# Altium footprint library Hydra_Ref_pcb.PcbLib: 353 footprints (part 16 of 23)
Each footprint in its own frame and in the unit in brackets; x right, y up, seen from the top. Pads: shape width x height; smd on the part's side, far side on the other; paste and mask are expansions set on the pad; w line width, h text height; cw(c..) or ccw(c..) is an arc to the next point about the centre after c.
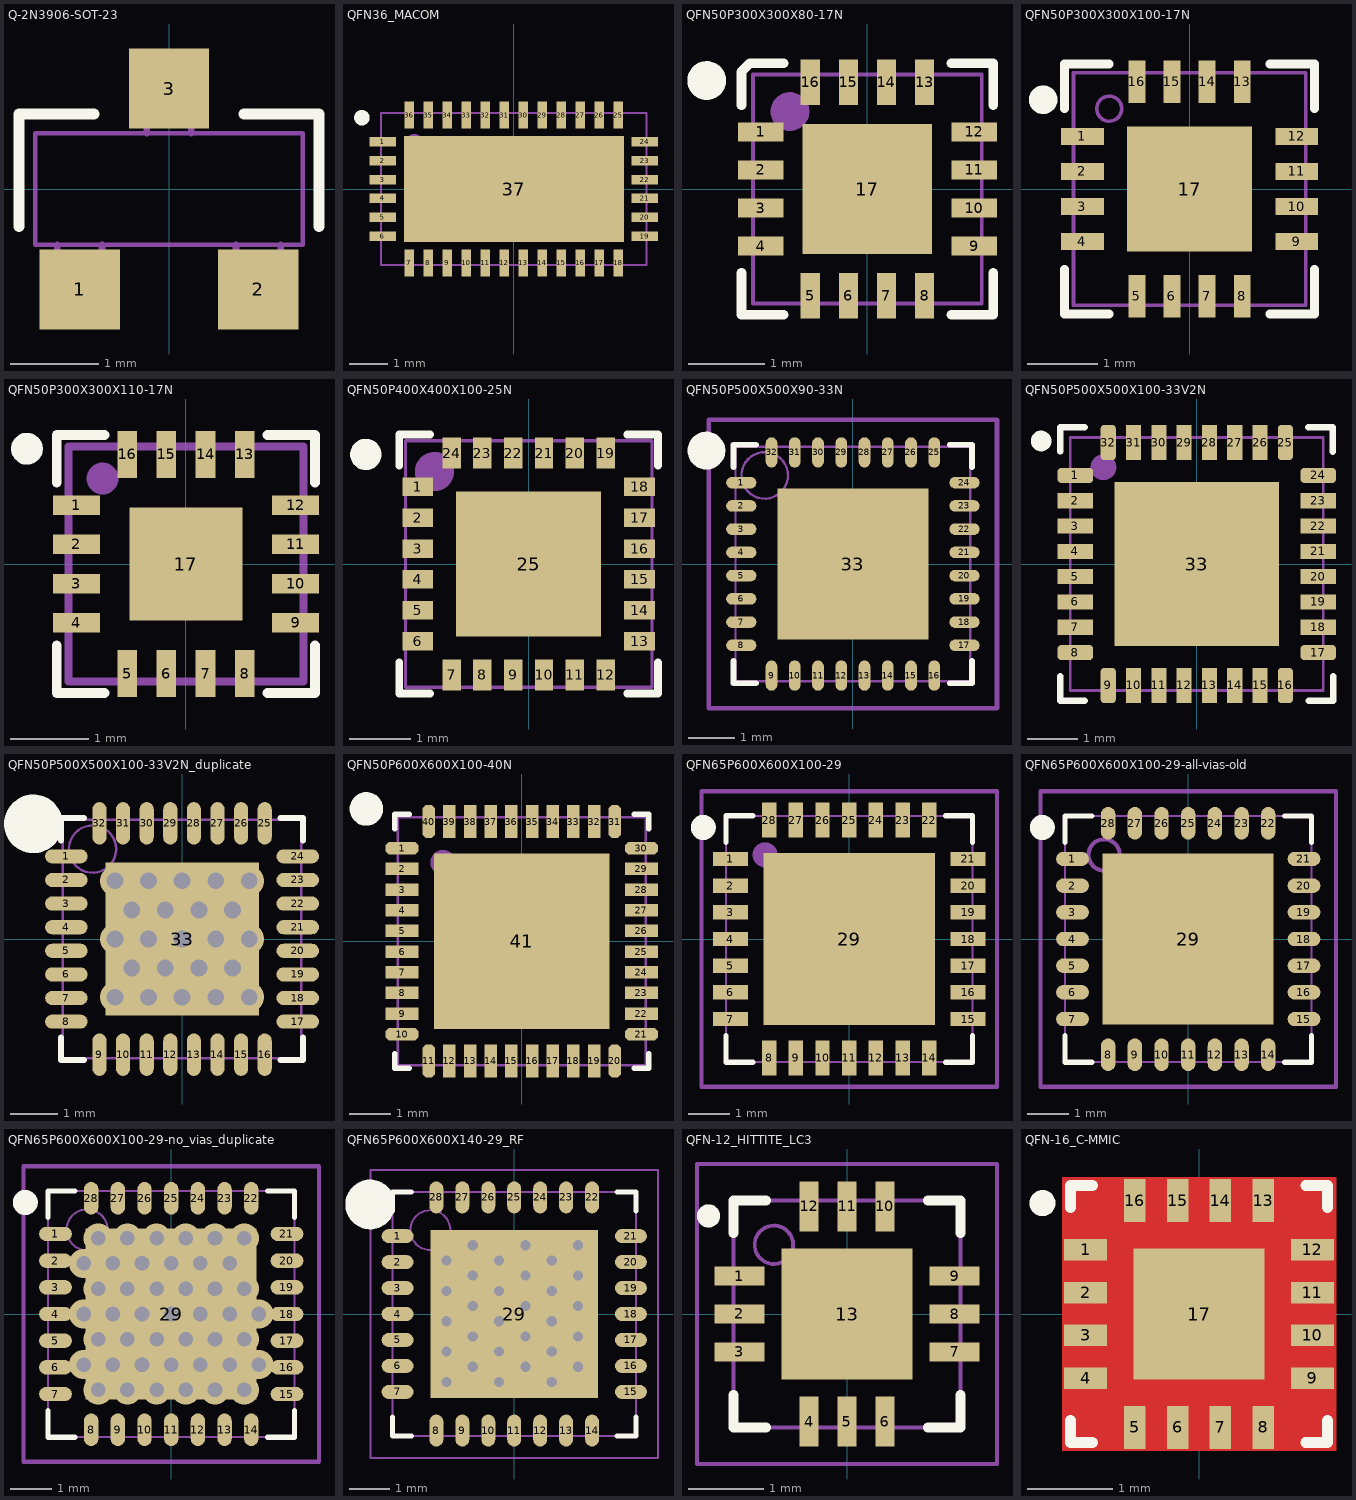
[diagram p15: the footprints below, top view; thin cyan lines are the x and y axes]

## Q-2N3906-SOT-23 [mil] "old part"
pads (3):
  rect 36x36 smd: 1(-40,-45) 2(40,-45) 3(0,45)
Top Overlay:
  lines w5: -67.2,-16.8 -67.2,33.6 -33.6,33.6 ; 33.6,33.6 67.2,33.6 67.2,-16.8
1 Board Outline:
  lines w3: -50,-40 -30,-40 ; -50,-25 -50,-50 -30,-50 -30,-25 ; -10,25 -10,50 10,50 10,25 ; -10,40 10,40 ; 30,-40 50,-40 ; 30,-25 30,-50 50,-50 50,-25
9 Top Assy:
  lines w2: -60,-25 60,-25 60,25 -60,25 -60,-25
  text ".Designator" at -50.4,-16.8 h30

## QFN36_MACOM [mm] "CSP-2, LEAD-FREE 4 X 7 MM, 36-LEAD PQFN"
height 1
pads (37):
  rect 0.7x0.25 smd mask+0.051: 1(-3.45,1.25) 2(-3.45,0.75) 3(-3.45,0.25) 4(-3.45,-0.25) 5(-3.45,-0.75) 6(-3.45,-1.25) 19(3.45,-1.25) 20(3.45,-0.75) 21(3.45,-0.25) 22(3.45,0.25) 23(3.45,0.75) 24(3.45,1.25)
  rect 0.25x0.7 smd mask+0.051: 7(-2.75,-1.95) 8(-2.25,-1.95) 9(-1.75,-1.95) 10(-1.25,-1.95) 11(-0.75,-1.95) 12(-0.25,-1.95) 13(0.25,-1.95) 14(0.75,-1.95) 15(1.25,-1.95) 16(1.75,-1.95) 17(2.25,-1.95) 18(2.75,-1.95) 25(2.75,1.95) 26(2.25,1.95) 27(1.75,1.95) 28(1.25,1.95) 29(0.75,1.95) 30(0.25,1.95) 31(-0.25,1.95) 32(-0.75,1.95) 33(-1.25,1.95) 34(-1.75,1.95) 35(-2.25,1.95) 36(-2.75,1.95)
  rect 5.8x2.8 smd mask-0.051: 37(0,0)
Top Overlay:
  circle w0.203: c-4.004,1.879 r0.102
9 Top Assy:
  circle w0.254: c-2.623,1.193 r0.127
  lines w0.051: -3.5,-2 3.5,-2 3.5,2 -3.5,2 -3.5,-2
  text ".Designator" at -1.79,-0.324 h0.76
3D body: height 1, standoff 0.01, extent -3.5,-2 3.5,2

## QFN50P300X300X80-17N [mm] "QFN-16PIN-3MMx3MM_.5mm Pitch .8 mm tall Nominal footprint"
height 0.813
pads (17):
  rect 0.6x0.25 smd mask+0.064: 1(-1.4,0.75) 2(-1.4,0.25) 3(-1.4,-0.25) 4(-1.4,-0.75) 9(1.4,-0.75) 10(1.4,-0.25) 11(1.4,0.25) 12(1.4,0.75)
  rect 0.25x0.6 smd mask+0.064: 5(-0.75,-1.4) 6(-0.25,-1.4) 7(0.25,-1.4) 8(0.75,-1.4) 13(0.75,1.4) 14(0.25,1.4) 15(-0.25,1.4) 16(-0.75,1.4)
  rect 1.7x1.7 smd mask+0.051: 17(0,0)
Top Overlay:
  circle w0.254: c-2.108,1.422 r0.127
  lines w0.127: -1.651,-1.1 -1.651,-1.651 -1.1,-1.651 ; -1.651,1.1 -1.651,1.54 -1.54,1.651 -1.1,1.651 ; 1.1,-1.651 1.651,-1.651 1.651,-1.1 ; 1.1,1.651 1.651,1.651 1.651,1.1
9 Top Assy:
  circle w0.254: c-1.016,1.016 r0.127
  lines w0.051: -1.5,-1.5 1.5,-1.5 1.5,1.5 -1.5,1.5 -1.5,-1.5
  text ".Designator" at -1.016,-0.229 h0.46
3D body: height 0.81, standoff 0.01, extent -1.5,-1.5 1.5,1.5

## QFN50P300X300X100-17N [mil] "QFN, 4X4+1-Leads, Body 3.1x3.1mm (max), Pitch 0.50mm, IPC Medium Density"
height 40
pads (17):
  rect 24x9.5 smd: 1(-60.04,29.53) 2(-60.04,9.84) 3(-60.04,-9.84) 4(-60.04,-29.53) 9(60.04,-29.53) 10(60.04,-9.84) 11(60.04,9.84) 12(60.04,29.53)
  rect 9.5x24 smd: 5(-29.53,-60.04) 6(-9.84,-60.04) 7(9.84,-60.04) 8(29.53,-60.04) 13(29.53,60.04) 14(9.84,60.04) 15(-9.84,60.04) 16(-29.53,60.04)
  rect 70x70 smd: 17(0,0)
Top Overlay:
  circle w8: c-82,50 r4
  lines w5: -70,-45 -70,-70 -45,-70 ; -70,45 -70,70 -45,70 ; 45,-70 70,-70 70,-45 ; 45,70 70,70 70,45
Top Solder:
  pour cut-out: -82.04,-44.28 -82.04,44.28 82.04,44.28 82.04,-44.28
  pour cut-out: 44.28,-82.04 -44.28,-82.04 -44.28,82.04 44.28,82.04
9 Top Assy:
  circle w2: c-45,45 r7
  lines w2: -65,-65 -65,65 65,65 65,-65 -65,-65
  text ".Designator" at -51,-8 h20
3D body: height 0.39, standoff 0, extent -82.68,-82.68 82.68,82.68
3D body: height 39.37, standoff 0, extent -67.09,-67.32 67.58,67.06

## QFN50P300X300X110-17N [mm] "QFN-16PIN-3MMx3MM_.5mm Pitch 1.1mm tall Nominal footprint"
height 1.092
pads (17):
  rect 0.6x0.25 smd: 1(-1.4,0.75) 2(-1.4,0.25) 3(-1.4,-0.25) 4(-1.4,-0.75) 9(1.4,-0.75) 10(1.4,-0.25) 11(1.4,0.25) 12(1.4,0.75)
  rect 0.25x0.6 smd: 5(-0.75,-1.4) 6(-0.25,-1.4) 7(0.25,-1.4) 8(0.75,-1.4) 13(0.75,1.4) 14(0.25,1.4) 15(-0.25,1.4) 16(-0.75,1.4)
  rect 1.448x1.448 smd: 17(0,0)
Top Overlay:
  circle w0.203: c-2.032,1.473 r0.102
  lines w0.127: -1.651,-1.041 -1.651,-1.651 -1.041,-1.651 ; -1.651,1.041 -1.651,1.651 -1.041,1.651 ; 1.041,-1.651 1.651,-1.651 1.651,-1.041 ; 1.041,1.651 1.651,1.651 1.651,1.041
9 Top Assy:
  circle w0.203: c-1.067,1.092 r0.102
  lines w0.051: -1.5,-1.5 -1.5,1.5 1.5,1.5 1.5,-1.5 -1.5,-1.5
  text ".Designator" at -1.32,-0.406 h0.51
13 Top 3D Bodies:
  lines w0.1: -1.5,-1.5 -1.5,1.5 1.5,1.5 1.5,-1.5 -1.5,-1.5
3D body: height 1.09, standoff 0.01, extent -2.159,-2.159 2.159,2.159

## QFN50P400X400X100-25N [mm]
height 1
pads (25):
  rect 0.5x0.3 smd mask+0.05: 1(-1.8,1.25) 2(-1.8,0.75) 3(-1.8,0.25) 4(-1.8,-0.25) 5(-1.8,-0.75) 6(-1.8,-1.25) 13(1.8,-1.25) 14(1.8,-0.75) 15(1.8,-0.25) 16(1.8,0.25) 17(1.8,0.75) 18(1.8,1.25)
  rect 0.3x0.5 smd mask+0.05: 7(-1.25,-1.8) 8(-0.75,-1.8) 9(-0.25,-1.8) 10(0.25,-1.8) 11(0.75,-1.8) 12(1.25,-1.8) 19(1.25,1.8) 20(0.75,1.8) 21(0.25,1.8) 22(-0.25,1.8) 23(-0.75,1.8) 24(-1.25,1.8)
  rect 2.35x2.35 smd mask+0.05: 25(0,0)
Top Overlay:
  circle w0.254: c-2.642,1.778 r0.127
  lines w0.127: -2.1,-1.6 -2.1,-2.1 -1.6,-2.1 ; -2.1,1.6 -2.1,2.1 -1.6,2.1 ; 1.6,-2.1 2.1,-2.1 2.1,-1.6 ; 1.6,2.1 2.1,2.1 2.1,1.6
9 Top Assy:
  circle w0.381: c-1.527,1.5 r0.127
  lines w0.051: -2,-2 2,-2 2,2 -2,2 -2,-2
  text ".Designator" at -1.288,-0.325 h0.76
3D body: height 1, standoff 0, extent -1.999,-1.999 1.999,1.999

## QFN50P500X500X90-33N [mm] "QFN, 33-Leads, Body 5x5x0.9mm, Pitch 0.50mm, IPC Medium Density"
height 0.9
pads (33):
  oval 0.65x0.25 smd: 1(-2.4,1.75) 2(-2.4,1.25) 3(-2.4,0.75) 4(-2.4,0.25) 5(-2.4,-0.25) 6(-2.4,-0.75) 7(-2.4,-1.25) 8(-2.4,-1.75) 17(2.4,-1.75) 18(2.4,-1.25) 19(2.4,-0.75) 20(2.4,-0.25) 21(2.4,0.25) 22(2.4,0.75) 23(2.4,1.25) 24(2.4,1.75)
  oval 0.25x0.65 smd: 9(-1.75,-2.4) 10(-1.25,-2.4) 11(-0.75,-2.4) 12(-0.25,-2.4) 13(0.25,-2.4) 14(0.75,-2.4) 15(1.25,-2.4) 16(1.75,-2.4) 25(1.75,2.4) 26(1.25,2.4) 27(0.75,2.4) 28(0.25,2.4) 29(-0.25,2.4) 30(-0.75,2.4) 31(-1.25,2.4) 32(-1.75,2.4)
  rect 3.25x3.25 smd: 33(0,0)
Top Overlay:
  circle w0.406: c-3.15,2.438 r0.203
  lines w0.127: -2.565,-2.083 -2.565,-2.565 -2.083,-2.565 ; -2.565,2.083 -2.565,2.565 -2.083,2.565 ; 2.083,-2.565 2.565,-2.565 2.565,-2.083 ; 2.083,2.565 2.565,2.565 2.565,2.083
9 Top Assy:
  circle w0.051: c-1.897,1.905 r0.5
  lines w0.051: -2.525,-2.525 2.525,-2.525 2.525,2.525 -2.525,2.525 -2.525,-2.525
  text ".Designator" at -2.286,-0.635 h1.27
15 Top Optical Placement:
  lines w0.1: -0.5,0 0.5,0 ; 0,-0.5 0,0.5 ; -3.1,-3.1 3.1,-3.1 3.1,3.1 -3.1,3.1 -3.1,-3.1
3D body: height 0.9, standoff 0.01, extent -3.1,-3.1 3.1,3.1

## QFN50P500X500X100-33V2N [mm] "Jedec-MO-220-VHHD-2; QFN, 33-Leads, Body 5x5x1mm, Pitch 0.50mm, IPC Medium Density"
height 1
pads (33):
  rrect50% 0.7x0.3 smd mask+0.044: 1(-2.4,1.75) 8(-2.4,-1.75) 17(2.4,-1.75) 24(2.4,1.75)
  rect 0.7x0.3 smd mask+0.044: 2(-2.4,1.25) 3(-2.4,0.75) 4(-2.4,0.25) 5(-2.4,-0.25) 6(-2.4,-0.75) 7(-2.4,-1.25) 18(2.4,-1.25) 19(2.4,-0.75) 20(2.4,-0.25) 21(2.4,0.25) 22(2.4,0.75) 23(2.4,1.25)
  rrect50% 0.3x0.7 smd mask+0.044: 9(-1.75,-2.4) 16(1.75,-2.4) 25(1.75,2.4) 32(-1.75,2.4)
  rect 0.3x0.7 smd mask+0.044: 10(-1.25,-2.4) 11(-0.75,-2.4) 12(-0.25,-2.4) 13(0.25,-2.4) 14(0.75,-2.4) 15(1.25,-2.4) 26(1.25,2.4) 27(0.75,2.4) 28(0.25,2.4) 29(-0.25,2.4) 30(-0.75,2.4) 31(-1.25,2.4)
  rect 3.25x3.25 smd paste-0.102 mask-0.102: 33(0,0)
Top Overlay:
  circle w0.203: c-3.076,2.431 r0.102
  lines w0.127: -2.7,-2.218 -2.7,-2.7 -2.218,-2.7 ; -2.696,2.222 -2.696,2.705 -2.214,2.705 ; 2.205,2.7 2.688,2.7 2.688,2.218 ; 2.215,-2.7 2.698,-2.7 2.698,-2.218
9 Top Assy:
  circle w0.254: c-1.844,1.911 r0.127
  lines w0.051: -2.5,-2.5 2.5,-2.5 2.5,2.5 -2.5,2.5 -2.5,-2.5
  text ".Designator" at -1.363,-0.337 h0.76
3D body: height 1, standoff 0.01, extent -2.5,-2.5 2.5,2.5

## QFN50P500X500X100-33V2N_duplicate [mm] "Jedec-MO-220-VHHD-2; QFN, 33-Leads, Body 5x5x1mm, Pitch 0.50mm, IPC Medium Density"
height 1
pads (33):
  oval 0.9x0.3 smd: 1(-2.45,1.75) 2(-2.45,1.25) 3(-2.45,0.75) 4(-2.45,0.25) 5(-2.45,-0.25) 6(-2.45,-0.75) 7(-2.45,-1.25) 8(-2.45,-1.75) 17(2.45,-1.75) 18(2.45,-1.25) 19(2.45,-0.75) 20(2.45,-0.25) 21(2.45,0.25) 22(2.45,0.75) 23(2.45,1.25) 24(2.45,1.75)
  oval 0.3x0.9 smd: 9(-1.75,-2.45) 10(-1.25,-2.45) 11(-0.75,-2.45) 12(-0.25,-2.45) 13(0.25,-2.45) 14(0.75,-2.45) 15(1.25,-2.45) 16(1.75,-2.45) 25(1.75,2.45) 26(1.25,2.45) 27(0.75,2.45) 28(0.25,2.45) 29(-0.25,2.45) 30(-0.75,2.45) 31(-1.25,2.45) 32(-1.75,2.45)
  rect 3.25x3.25 smd: 33(0,0)
via 1.422,1.232 diameter 0.635 hole 0.356
via 0.711,1.232 diameter 0.635 hole 0.356
via 0,1.232 diameter 0.635 hole 0.356
via 0,0 diameter 0.635 hole 0.356
via -0.356,0.616 diameter 0.635 hole 0.356
via -0.711,0 diameter 0.635 hole 0.356
via -1.067,0.616 diameter 0.635 hole 0.356
via -0.711,1.232 diameter 0.635 hole 0.356
via 0.356,-0.616 diameter 0.635 hole 0.356
via 0,-1.232 diameter 0.635 hole 0.356
via 0.711,-1.232 diameter 0.635 hole 0.356
via -0.711,-1.232 diameter 0.635 hole 0.356
via -1.067,-0.616 diameter 0.635 hole 0.356
via -1.422,0 diameter 0.635 hole 0.356
via -0.356,-0.616 diameter 0.635 hole 0.356
via -1.422,-1.232 diameter 0.635 hole 0.356
via 1.422,0 diameter 0.635 hole 0.356
via -1.422,1.232 diameter 0.635 hole 0.356
via 1.422,-1.232 diameter 0.635 hole 0.356
via 1.067,-0.616 diameter 0.635 hole 0.356
via 1.067,0.616 diameter 0.635 hole 0.356
via 0.356,0.616 diameter 0.635 hole 0.356
via 0.711,0 diameter 0.635 hole 0.356
Top Overlay:
  circle w0.635: c-3.15,2.438 r0.305
  lines w0.127: -2.565,-2.083 -2.565,-2.565 -2.083,-2.565 ; -2.565,2.083 -2.565,2.565 -2.083,2.565 ; 2.083,-2.565 2.565,-2.565 2.565,-2.083 ; 2.083,2.565 2.565,2.565 2.565,2.083
9 Top Assy:
  circle w0.051: c-1.897,1.905 r0.5
  lines w0.051: -2.525,-2.525 -2.525,2.525 2.525,2.525 2.525,-2.525 -2.525,-2.525
  text ".Designator" at 2.031,-0.459 h1.27
3D body: height 1, standoff 0.01, extent -3.1,-3.1 3.1,3.1

## QFN50P600X600X100-40N [mm] "QFN, 40-Leads, Body 6.0x6.0mm (max), Pitch 0.50mm, IPC Medium Density"
height 1
pads (41):
  oct 0.8x0.3 smd: 1(-2.896,2.25) 10(-2.896,-2.25) 21(2.896,-2.25) 30(2.896,2.25)
  rect 0.8x0.3 smd: 2(-2.896,1.75) 3(-2.896,1.25) 4(-2.896,0.75) 5(-2.896,0.25) 6(-2.896,-0.25) 7(-2.896,-0.75) 8(-2.896,-1.25) 9(-2.896,-1.75) 22(2.896,-1.75) 23(2.896,-1.25) 24(2.896,-0.75) 25(2.896,-0.25) 26(2.896,0.25) 27(2.896,0.75) 28(2.896,1.25) 29(2.896,1.75)
  oct 0.3x0.8 smd: 11(-2.25,-2.896) 20(2.25,-2.896) 31(2.25,2.896) 40(-2.25,2.896)
  rect 0.3x0.8 smd: 12(-1.75,-2.896) 13(-1.25,-2.896) 14(-0.75,-2.896) 15(-0.25,-2.896) 16(0.25,-2.896) 17(0.75,-2.896) 18(1.25,-2.896) 19(1.75,-2.896) 32(1.75,2.896) 33(1.25,2.896) 34(0.75,2.896) 35(0.25,2.896) 36(-0.25,2.896) 37(-0.75,2.896) 38(-1.25,2.896) 39(-1.75,2.896)
  rect 4.25x4.25 smd: 41(0,0)
Top Overlay:
  circle w0.406: c-3.759,3.2 r0.203
  lines w0.127: -3.073,-2.718 -3.073,-3.073 -2.718,-3.073 ; -3.073,2.718 -3.073,3.073 -2.718,3.073 ; 2.718,-3.073 3.073,-3.073 3.073,-2.718 ; 2.718,3.073 3.073,3.073 3.073,2.718
9 Top Assy:
  circle w0.305: c-1.905,1.905 r0.152
  lines w0.05: -3,-3 3,-3 3,3 -3,3 -3,-3
  text ".Designator" at -1.651,-0.203 h0.64
3D body: height 1, standoff 0, extent -3,-3 3,2.997

## QFN65P600X600X100-29 [mm] "QFN, 28-Leads, Body 6.0x6.0mm (max), Pitch 0.65mm, TRIQUINT"
height 1
pads (29):
  rect 0.85x0.35 smd mask+0.051: 1(-2.895,1.95) 2(-2.895,1.3) 3(-2.895,0.65) 4(-2.895,0) 5(-2.895,-0.65) 6(-2.895,-1.3) 7(-2.895,-1.95) 15(2.895,-1.95) 16(2.895,-1.3) 17(2.895,-0.65) 18(2.895,0) 19(2.895,0.65) 20(2.895,1.3) 21(2.895,1.95)
  rect 0.35x0.85 smd mask+0.051: 8(-1.95,-2.895) 9(-1.3,-2.895) 10(-0.65,-2.895) 11(0,-2.895) 12(0.65,-2.895) 13(1.3,-2.895) 14(1.95,-2.895) 22(1.95,2.895) 23(1.3,2.895) 24(0.65,2.895) 25(0,2.895) 26(-0.65,2.895) 27(-1.3,2.895) 28(-1.95,2.895)
  rect 4.18x4.18 smd mask+0.051: 29(0,0)
Top Overlay:
  circle w0.305: c-3.556,2.718 r0.152
  lines w0.127: -3,-2.35 -3,-3 -2.35,-3 ; -3,2.35 -3,3 -2.35,3 ; 2.35,-3 3,-3 3,-2.35 ; 2.35,3 3,3 3,2.35
Top Solder:
  pour cut-out: -2.259,3.454 2.261,3.454 3.454,2.261 3.454,-2.261 2.261,-3.454 -2.261,-3.454 -3.454,-2.261 -3.454,2.293
Bottom Solder:
  rectangle: -2.134,-2.134 2.134,2.134
9 Top Assy:
  circle w0.305: c-2.05,2.05 r0.152
  lines w0.051: -3,-3 -3,3 3,3 3,-3 -3,-3
  text ".Designator" at -2.489,-0.533 h1.27
13 Top 3D Bodies:
  lines w0.051: -3,3 3,3
15 Top Optical Placement:
  lines w0.1: -0.5,0 0.5,0 ; 0,-0.5 0,0.5 ; -3.6,-3.6 -3.6,3.6 3.6,3.6 3.6,-3.6 -3.6,-3.6
3D body: height 1, standoff 0.01, extent -3,-3 3.004,3

## QFN65P600X600X100-29-all-vias-old [mm] "QFN, 28-Leads, Body 6.0x6.0mm (max), Pitch 0.65mm, TRIQUINT"
height 1
pads (29):
  oval 0.8x0.35 smd: 1(-2.82,1.95) 2(-2.82,1.3) 3(-2.82,0.65) 4(-2.82,0) 5(-2.82,-0.65) 6(-2.82,-1.3) 7(-2.82,-1.95) 15(2.82,-1.95) 16(2.82,-1.3) 17(2.82,-0.65) 18(2.82,0) 19(2.82,0.65) 20(2.82,1.3) 21(2.82,1.95)
  oval 0.35x0.8 smd: 8(-1.95,-2.82) 9(-1.3,-2.82) 10(-0.65,-2.82) 11(0,-2.82) 12(0.65,-2.82) 13(1.3,-2.82) 14(1.95,-2.82) 22(1.95,2.82) 23(1.3,2.82) 24(0.65,2.82) 25(0,2.82) 26(-0.65,2.82) 27(-1.3,2.82) 28(-1.95,2.82)
  rect 4.166x4.166 smd: 29(0,0)
Top Overlay:
  circle w0.305: c-3.556,2.718 r0.152
  lines w0.127: -3,-2.35 -3,-3 -2.35,-3 ; -3,2.35 -3,3 -2.35,3 ; 2.35,-3 3,-3 3,-2.35 ; 2.35,3 3,3 3,2.35
9 Top Assy:
  circle w0.102: c-2.05,2.05 r0.381
  lines w0.051: -3,-3 -3,3 3,3 3,-3 -3,-3
13 Top 3D Bodies:
  lines w0.051: -3.6,-3.6 3.6,-3.6 3.6,3.6 -3.6,3.6 -3.6,-3.6
15 Top Optical Placement:
  lines w0.1: -0.5,0 0.5,0 ; 0,-0.5 0,0.5 ; -3.6,-3.6 -3.6,3.6 3.6,3.6 3.6,-3.6 -3.6,-3.6
3D body: height 1, standoff 0.01, extent -3.6,-3.617 3.602,3.603

## QFN65P600X600X100-29-no_vias_duplicate [mm] "QFN, 28-Leads, Body 6.0x6.0mm (max), Pitch 0.65mm, TRIQUINT"
height 1
pads (29):
  oval 0.8x0.35 smd: 1(-2.82,1.95) 2(-2.82,1.3) 3(-2.82,0.65) 4(-2.82,0) 5(-2.82,-0.65) 6(-2.82,-1.3) 7(-2.82,-1.95) 15(2.82,-1.95) 16(2.82,-1.3) 17(2.82,-0.65) 18(2.82,0) 19(2.82,0.65) 20(2.82,1.3) 21(2.82,1.95)
  oval 0.35x0.8 smd: 8(-1.95,-2.82) 9(-1.3,-2.82) 10(-0.65,-2.82) 11(0,-2.82) 12(0.65,-2.82) 13(1.3,-2.82) 14(1.95,-2.82) 22(1.95,2.82) 23(1.3,2.82) 24(0.65,2.82) 25(0,2.82) 26(-0.65,2.82) 27(-1.3,2.82) 28(-1.95,2.82)
  rect 4.166x4.166 smd: 29(0,0)
via -2.134,1.232 diameter 0.711 hole 0.356
via 2.134,0 diameter 0.711 hole 0.356
via 2.134,-1.232 diameter 0.711 hole 0.356
via -2.134,-1.232 diameter 0.711 hole 0.356
via -2.134,0 diameter 0.711 hole 0.356
via -1.778,1.848 diameter 0.711 hole 0.356
via -1.067,1.848 diameter 0.711 hole 0.356
via -0.356,1.848 diameter 0.711 hole 0.356
via 0.356,1.848 diameter 0.711 hole 0.356
via 1.067,1.848 diameter 0.711 hole 0.356
via 1.778,1.848 diameter 0.711 hole 0.356
via 1.778,0.616 diameter 0.711 hole 0.356
via -1.778,0.616 diameter 0.711 hole 0.356
via -1.778,-0.616 diameter 0.711 hole 0.356
via -1.778,-1.848 diameter 0.711 hole 0.356
via -1.067,-1.848 diameter 0.711 hole 0.356
via -0.356,-1.848 diameter 0.711 hole 0.356
via 0.356,-1.848 diameter 0.711 hole 0.356
via 1.067,-1.848 diameter 0.711 hole 0.356
via 1.778,-1.848 diameter 0.711 hole 0.356
via 1.778,-0.616 diameter 0.711 hole 0.356
via 1.422,-1.232 diameter 0.711 hole 0.356
via -1.422,-1.232 diameter 0.711 hole 0.356
via -1.422,1.232 diameter 0.711 hole 0.356
via 1.422,1.232 diameter 0.711 hole 0.356
via 1.422,0 diameter 0.711 hole 0.356
via -1.422,0 diameter 0.711 hole 0.356
via -1.067,-0.616 diameter 0.711 hole 0.356
via 0.711,-1.232 diameter 0.711 hole 0.356
via 0,-1.232 diameter 0.711 hole 0.356
via -0.711,-1.232 diameter 0.711 hole 0.356
via -1.067,0.616 diameter 0.711 hole 0.356
via -0.711,0 diameter 0.711 hole 0.356
via -0.356,-0.616 diameter 0.711 hole 0.356
via 1.067,-0.616 diameter 0.711 hole 0.356
via 0.356,-0.616 diameter 0.711 hole 0.356
via 1.067,0.616 diameter 0.711 hole 0.356
via 0.711,1.232 diameter 0.711 hole 0.356
via -0.711,1.232 diameter 0.711 hole 0.356
via -0.356,0.616 diameter 0.711 hole 0.356
via 0,1.232 diameter 0.711 hole 0.356
via 0.356,0.616 diameter 0.711 hole 0.356
via 0.711,0 diameter 0.711 hole 0.356
via 0,0 diameter 0.711 hole 0.356
Top Overlay:
  circle w0.305: c-3.556,2.718 r0.152
  lines w0.127: -3,-2.35 -3,-3 -2.35,-3 ; -3,2.35 -3,3 -2.35,3 ; 2.35,-3 3,-3 3,-2.35 ; 2.35,3 3,3 3,2.35
9 Top Assy:
  circle w0.051: c-2.05,2.05 r0.5
  lines w0.051: -3,-3 -3,3 3,3 3,-3 -3,-3
13 Top 3D Bodies:
  lines w0.051: -3.6,-3.6 3.6,-3.6 3.6,3.6 -3.6,3.6 -3.6,-3.6
15 Top Optical Placement:
  lines w0.1: -0.5,0 0.5,0 ; 0,-0.5 0,0.5 ; -3.6,-3.6 -3.6,3.6 3.6,3.6 3.6,-3.6 -3.6,-3.6
3D body: height 1, standoff 0.01, extent -3.6,-3.617 3.602,3.603

## QFN65P600X600X140-29_RF [mm] "QFN, 29-Leads, Body 6.1x6.1mm (max), Pitch 0.65mm, TriQuint Footpring"
height 1.422
pads (29):
  oval 0.8x0.35 smd: 1(-2.92,1.95) 2(-2.92,1.3) 3(-2.92,0.65) 4(-2.92,0) 5(-2.92,-0.65) 6(-2.92,-1.3) 7(-2.92,-1.95) 15(2.92,-1.95) 16(2.92,-1.3) 17(2.92,-0.65) 18(2.92,0) 19(2.92,0.65) 20(2.92,1.3) 21(2.92,1.95)
  oval 0.35x0.8 smd: 8(-1.95,-2.92) 9(-1.3,-2.92) 10(-0.65,-2.92) 11(0,-2.92) 12(0.65,-2.92) 13(1.3,-2.92) 14(1.95,-2.92) 22(1.95,2.92) 23(1.3,2.92) 24(0.65,2.92) 25(0,2.92) 26(-0.65,2.92) 27(-1.3,2.92) 28(-1.95,2.92)
  rect 4.2x4.2 all layers, no hole: 29(0,0)
via 1.6,-0.56 diameter 0.6 hole 0.254
via 0.94,-0.94 diameter 0.6 hole 0.254
via 0.28,-0.56 diameter 0.6 hole 0.254
via -0.38,-0.94 diameter 0.6 hole 0.254
via -1.04,-0.56 diameter 0.6 hole 0.254
via -1.7,-0.94 diameter 0.6 hole 0.254
via -1.7,-1.7 diameter 0.6 hole 0.254
via 1.6,-1.32 diameter 0.6 hole 0.254
via 0.94,-1.7 diameter 0.6 hole 0.254
via 0.28,-1.32 diameter 0.6 hole 0.254
via -1.04,-1.32 diameter 0.6 hole 0.254
via -0.38,-1.7 diameter 0.6 hole 0.254
via -1.7,-0.18 diameter 0.6 hole 0.254
via -1.04,0.2 diameter 0.6 hole 0.254
via -0.38,-0.18 diameter 0.6 hole 0.254
via 0.28,0.2 diameter 0.6 hole 0.254
via 0.94,-0.18 diameter 0.6 hole 0.254
via 1.6,0.2 diameter 0.6 hole 0.254
via 1.6,1.72 diameter 0.6 hole 0.254
via 0.94,1.34 diameter 0.6 hole 0.254
via 0.28,1.72 diameter 0.6 hole 0.254
via -0.38,1.34 diameter 0.6 hole 0.254
via -1.04,1.72 diameter 0.6 hole 0.254
via -1.7,1.34 diameter 0.6 hole 0.254
via -1.7,0.58 diameter 0.6 hole 0.254
via -1.04,0.96 diameter 0.6 hole 0.254
via -0.38,0.58 diameter 0.6 hole 0.254
via 0.28,0.96 diameter 0.6 hole 0.254
via 0.94,0.58 diameter 0.6 hole 0.254
via 1.6,0.96 diameter 0.6 hole 0.254
Top Overlay:
  circle w0.635: c-3.607,2.743 r0.305
  lines w0.127: -3.05,-2.575 -3.05,-3.05 -2.575,-3.05 ; -3.05,2.575 -3.05,3.05 -2.575,3.05 ; 2.575,-3.05 3.05,-3.05 3.05,-2.575 ; 2.575,3.05 3.05,3.05 3.05,2.575
9 Top Assy:
  circle w0.051: c-2.1,2.1 r0.5
  lines w0.051: -3.05,-3.05 3.05,-3.05 3.05,3.05 -3.05,3.05 -3.05,-3.05
  text ".Designator" at -1.288,-0.325 h0.76
13 Top 3D Bodies:
  lines w0.051: -3.6,-3.6 3.6,-3.6 3.6,3.6 -3.6,3.6 -3.6,-3.6
3D body: height 1.42, standoff 0.01, extent -3.6,-3.6 3.6,3.6

## QFN-12_HITTITE_LC3 [mil] "LC3 – 3 x 3 mm QFN CERAMIC  HIGH FREQUENCY SMT PACKAGE, 36mil height"
height 36
pads (13):
  rect 26x10 smd mask-13: 1(-56,19.71) 2(-56,0.01) 3(-56,-19.69) 7(56,-19.71) 8(56,-0.01) 9(56,19.69)
  rect 10x26 smd mask-13: 4(-19.71,-56) 5(-0.01,-56) 6(19.69,-56) 10(19.71,56) 11(0.01,56) 12(-19.69,56)
  rect 68x68 smd paste-34 mask-34: 13(0,0)
Top Overlay:
  circle w6: c-72,51 r3
  lines w5: -59,-42 -59,-59 -42,-59 ; -59,42 -59,59 -42,59 ; 42,-59 59,-59 59,-42 ; 42,59 59,59 59,42
Top Paste:
  region: -30,20 -20,30 30,30 30,-30 -30,-30
Top Solder:
  pour cut-out: -47.5,78 -47.5,47.5 -78,47.5 -78,-47.5 -47.5,-47.5 -47.5,-78 47.5,-78 47.5,-47.5 78,-47.5 78,47.5 47.5,47.5 47.5,78
  region: 69,38.5 43.5,38.5 39,34 39,-34 43.5,-38.5 69,-38.5
  region: 38.5,-69 38.5,-43.5 34,-39 -34,-39 -38.5,-43.5 -38.5,-69
  region: -69,-38.5 -43.5,-38.5 -39,-34 -39,34 -43.5,38.5 -69,38.5
  region: -38.5,69 -38.5,43.5 -34,39 34,39 38.5,43.5 38.5,69
  region: -30,20 -20,30 30,30 30,-30 -30,-30
9 Top Assy:
  circle w2: c-38,36 r10
  lines w2: -59.06,-59.06 -59.06,59.06 59.06,59.06 59.06,-59.06 -59.06,-59.06
  text ".Designator" at -43.74,-12.5 h25
15 Top Optical Placement:
  lines w2: -78,-78 -78,78 78,78 78,-78 -78,-78
  lines w3.94: -19.68,0 19.68,0 ; 0,-19.68 0,19.68
3D body: height 36, standoff 0, extent -59.04,-59.04 59.04,59.04

## QFN-16_C-MMIC [mm] "QFN-16 C-MMIC"
height 1
pads (17):
  rect 0.5x0.25 smd mask+0.051: 1(-1.325,0.75) 2(-1.325,0.25) 3(-1.325,-0.25) 4(-1.325,-0.75) 9(1.325,-0.75) 10(1.325,-0.25) 11(1.325,0.25) 12(1.325,0.75)
  rect 0.25x0.5 smd mask+0.051: 5(-0.75,-1.325) 6(-0.25,-1.325) 7(0.25,-1.325) 8(0.75,-1.325) 13(0.75,1.325) 14(0.25,1.325) 15(-0.25,1.325) 16(-0.75,1.325)
  rect 1.53x1.53 smd mask+0.051: 17(0,0)
Top Layer:
  pour cut-out: -1.6,1.6 1.6,1.6 1.6,-1.6 -1.6,-1.6
Top Overlay:
  circle w0.152: c-1.829,1.295 r0.076
  lines w0.127: -1.5,-1.246 -1.5,-1.5 -1.246,-1.5 ; -1.5,1.246 -1.5,1.5 -1.246,1.5 ; 1.246,-1.5 1.5,-1.5 1.5,-1.246 ; 1.246,1.5 1.5,1.5 1.5,1.246
9 Top Assy:
  circle w0.152: c-1.092,1.143 r0.076
  lines w0.051: -1.5,-1.5 1.5,-1.5 1.5,1.5 -1.5,1.5 -1.5,-1.5
  text ".Designator" at -0.762,-0.25 h0.46
3D body: height 1, standoff 0.01, extent -1.5,-1.5 1.504,1.5